# Altium footprint library DebouncingToolESD.PcbLib: 30 footprints (part 2 of 2)
Each footprint in its own frame and in the unit in brackets; x right, y up, seen from the top. Pads: shape width x height; smd on the part's side, far side on the other; paste and mask are expansions set on the pad; w line width, h text height; cw(c..) or ccw(c..) is an arc to the next point about the centre after c.
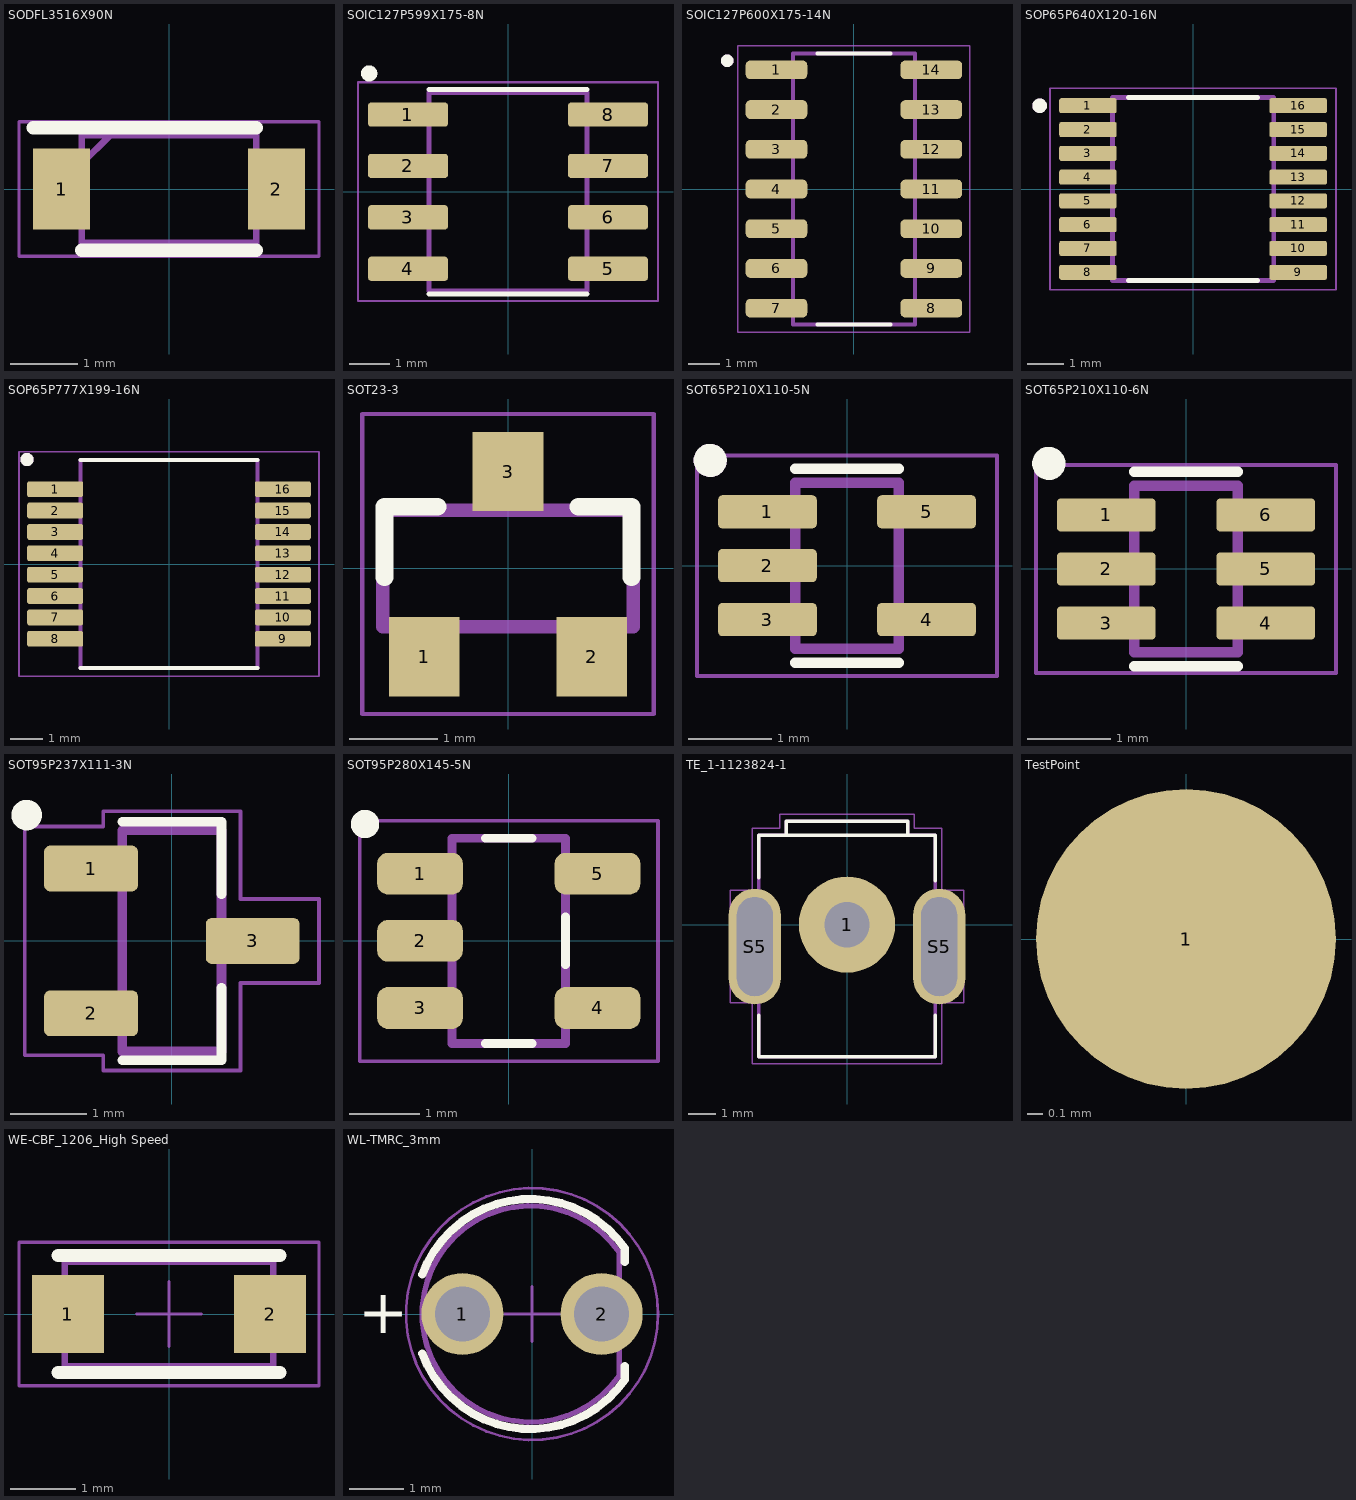
[diagram p1: the footprints below, top view; thin cyan lines are the x and y axes]

## SODFL3516X90N [mm]
pads (2):
  rect 0.85x1.2 smd: 1(-1.6,0) 2(1.6,0)
Top Overlay:
  lines w0.2: -2.02,0.914 1.3,0.914 ; -1.3,-0.914 1.3,-0.914
Mechanical 13:
  lines w0.1: -1.3,0.38 -0.88,0.8 ; -1.3,-0.8 1.3,-0.8 1.3,0.8 -1.3,0.8 -1.3,-0.8
Mechanical 15:
  lines w0.05: -2.235,-1 2.235,-1 2.235,1 -2.235,1 -2.235,-1
3D body "RB160MM-50TFTR.stp": height 0.9, standoff 0, extent -1.75,-0.8 1.75,0.8

## SOIC127P599X175-8N [mm]
pads (8):
  rrect25% 1.97x0.6 smd: 1(-2.47,1.905) 2(-2.47,0.635) 3(-2.47,-0.635) 4(-2.47,-1.905) 5(2.47,-1.905) 6(2.47,-0.635) 7(2.47,0.635) 8(2.47,1.905)
Top Overlay:
  circle w0.2: c-3.429,2.921 r0.1
  lines w0.127: -1.95,-2.525 1.95,-2.525 ; -1.95,2.525 1.95,2.525
Mechanical 13:
  lines w0.127: -1.95,-2.452 -1.95,2.452 1.95,2.452 1.95,-2.452 -1.95,-2.452
Mechanical 15:
  lines w0.05: -3.705,-2.702 -3.705,2.702 3.705,2.702 3.705,-2.702 -3.705,-2.702
3D body "TLV3502AIDR.STEP": height 1.75, standoff 0, extent -3,-2.45 3,2.45

## SOIC127P600X175-14N [mm]
pads (14):
  rrect50% 1.97x0.6 smd: 1(-2.475,3.81) 2(-2.475,2.54) 3(-2.475,1.27) 4(-2.475,0) 5(-2.475,-1.27) 6(-2.475,-2.54) 7(-2.475,-3.81) 8(2.475,-3.81) 9(2.475,-2.54) 10(2.475,-1.27) 11(2.475,0) 12(2.475,1.27) 13(2.475,2.54) 14(2.475,3.81)
Top Overlay:
  circle w0.2: c-4.05,4.1 r0.1
  lines w0.127: -1.17,-4.325 1.17,-4.325 ; -1.17,4.325 1.17,4.325
Mechanical 13:
  circle w0.2: c-4.05,4.1 r0.1
  lines w0.127: -1.95,-4.325 1.95,-4.325 1.95,4.325 -1.95,4.325 -1.95,-4.325
Mechanical 15:
  lines w0.05: -3.71,-4.575 3.71,-4.575 3.71,4.575 -3.71,4.575 -3.71,-4.575
3D body "step_temp.STEP": height 1.75, standoff 0, extent -3,-4.325 3,4.325

## SOP65P640X120-16N [mm]
pads (16):
  rrect25% 1.57x0.41 smd: 1(-2.87,2.275) 2(-2.87,1.625) 3(-2.87,0.975) 4(-2.87,0.325) 5(-2.87,-0.325) 6(-2.87,-0.975) 7(-2.87,-1.625) 8(-2.87,-2.275) 9(2.87,-2.275) 10(2.87,-1.625) 11(2.87,-0.975) 12(2.87,-0.325) 13(2.87,0.325) 14(2.87,0.975) 15(2.87,1.625) 16(2.87,2.275)
Top Overlay:
  circle w0.2: c-4.19,2.275 r0.1
  lines w0.127: -1.765,-2.5 1.765,-2.5 ; -1.765,2.5 1.765,2.5
Mechanical 13:
  circle w0.2: c-4.19,2.275 r0.1
  lines w0.127: -2.2,-2.5 2.2,-2.5 2.2,2.5 -2.2,2.5 -2.2,-2.5
Mechanical 15:
  lines w0.05: -3.905,-2.75 3.905,-2.75 3.905,2.75 -3.905,2.75 -3.905,-2.75
3D body "CD74HC123PWR.STEP": height 1.2, standoff 0, extent -3.2,-2.5 3.2,2.5

## SOP65P777X199-16N [mm]
pads (16):
  rrect25% 1.7x0.48 smd: 1(-3.46,2.275) 2(-3.46,1.625) 3(-3.46,0.975) 4(-3.46,0.325) 5(-3.46,-0.325) 6(-3.46,-0.975) 7(-3.46,-1.625) 8(-3.46,-2.275) 9(3.46,-2.275) 10(3.46,-1.625) 11(3.46,-0.975) 12(3.46,-0.325) 13(3.46,0.325) 14(3.46,0.975) 15(3.46,1.625) 16(3.46,2.275)
Top Overlay:
  circle w0.2: c-4.318,3.175 r0.1
  lines w0.127: -2.69,-3.165 2.69,-3.165 ; -2.69,3.165 2.69,3.165
Mechanical 13:
  circle w0.2: c-4.318,3.175 r0.1
  lines w0.127: -2.69,-3.165 2.69,-3.165 2.69,3.165 -2.69,3.165 -2.69,-3.165
Mechanical 15:
  lines w0.05: -4.56,-3.415 4.56,-3.415 4.56,3.415 -4.56,3.415 -4.56,-3.415
3D body "21-0056C_16.step": height 1.98, standoff 0, extent -3.95,-3.162 3.95,3.162

## SOT23-3 [mm]
pads (3):
  rect 0.8x0.9 smd: 1(-0.95,-1) 2(0.95,-1) 3(0,1.1)
Top Overlay:
  lines w0.203: -1.4,-0.1 -1.4,0.7 -0.8,0.7 ; 0.8,0.7 1.4,0.7 1.4,-0.1
Mechanical 13:
  lines w0.152: -1.422,-0.66 1.422,-0.66 1.422,0.66 -1.422,0.66 -1.422,-0.66
Mechanical 15:
  lines w0.051: -1.651,-1.651 1.651,-1.651 1.651,1.753 -1.651,1.753 -1.651,-1.651
3D body "2N7002--3DModel-STEP-56544.STEP": height 1.24, standoff -0.01, extent -1.463,-1.4 1.463,1.4

## SOT65P210X110-5N [mm]
pads (5):
  rrect25% 1.19x0.4 smd: 1(-0.96,0.65) 2(-0.96,0) 3(-0.96,-0.65) 4(0.96,-0.65) 5(0.96,0.65)
Top Overlay:
  circle w0.2: c-1.651,1.27 r0.1
  lines w0.127: -0.625,-1.17 0.625,-1.17 ; -0.625,1.17 0.625,1.17
Mechanical 13:
  circle w0.2: c-1.651,1.27 r0.1
  lines w0.127: -0.625,-1 0.625,-1 0.625,1 -0.625,1 -0.625,-1
Mechanical 15:
  lines w0.05: -1.81,-1.33 1.81,-1.33 1.81,1.33 -1.81,1.33 -1.81,-1.33
3D body "3K.STEP": height 1.1, standoff 0, extent -1.05,-1 1.05,1

## SOT65P210X110-6N [mm]
pads (6):
  rrect25% 1.19x0.4 smd: 1(-0.96,0.65) 2(-0.96,0) 3(-0.96,-0.65) 4(0.96,-0.65) 5(0.96,0) 6(0.96,0.65)
Top Overlay:
  circle w0.2: c-1.651,1.27 r0.1
  lines w0.127: -0.625,-1.17 0.625,-1.17 ; -0.625,1.17 0.625,1.17
Mechanical 13:
  lines w0.127: -0.625,-1 0.625,-1 0.625,1 -0.625,1 -0.625,-1
Mechanical 15:
  lines w0.05: -1.805,-1.25 1.805,-1.25 1.805,1.25 -1.805,1.25 -1.805,-1.25
3D body "SN74LVC2G17MDCKREP.STEP": height 1.1, standoff 0, extent -1.05,-1 1.05,1

## SOT95P237X111-3N [mm]
pads (3):
  rrect25% 1.23x0.6 smd: 1(-1.06,0.95) 2(-1.06,-0.95) 3(1.06,0)
Top Overlay:
  circle w0.2: c-1.905,1.651 r0.1
  lines w0.127: -0.65,-1.564 0.65,-1.564 0.65,-0.614 ; -0.65,1.564 0.65,1.564 0.65,0.614
Mechanical 13:
  lines w0.127: -0.65,-1.45 -0.65,1.45 0.65,1.45 0.65,-1.45 -0.65,-1.45
Mechanical 15:
  lines w0.05: -1.93,-1.5 -0.9,-1.5 -0.9,-1.7 0.9,-1.7 0.9,-0.55 1.93,-0.55 1.93,0.55 0.9,0.55 0.9,1.7 -0.9,1.7 -0.9,1.5 -1.93,1.5 -1.93,-1.5
3D body "step_temp.STEP": height 1.11, standoff 0, extent -1.2,-1.45 1.2,1.45

## SOT95P280X145-5N [mm]
pads (5):
  rrect50% 1.21x0.59 smd: 1(-1.255,0.95) 2(-1.255,0) 3(-1.255,-0.95) 4(1.255,-0.95) 5(1.255,0.95)
Top Overlay:
  circle w0.2: c-2.032,1.651 r0.1
  lines w0.127: -0.33,-1.45 0.33,-1.45 ; -0.33,1.45 0.33,1.45 ; 0.8,-0.335 0.8,0.335
Mechanical 13:
  lines w0.127: -0.8,-1.45 0.8,-1.45 0.8,1.45 -0.8,1.45 -0.8,-1.45
Mechanical 15:
  lines w0.05: -2.11,-1.7 -2.11,1.7 2.11,1.7 2.11,-1.7 -2.11,-1.7
3D body "SN74LVC1G32QDBVRQ1.STEP": height 1.45, standoff 0, extent -1.4,-1.45 1.4,1.45

## TE_1-1123824-1 [mm]
pads (3):
  round 3.5 hole 1.65: 1(0,0)
  oval 1.9x4.2 hole 1.3 slot 3.6 at 90 deg: S5(-3.35,-0.8) S5(3.35,-0.8)
Top Overlay:
  lines w0.127: -3.2,-3.3 -3.2,-4.8 3.2,-4.8 3.2,-3.3 ; -3.2,1.7 -3.2,3.25 -2.2,3.25 ; 3.2,1.6 3.2,3.25 2.2,3.25 ; -2.2,3.25 2.2,3.25 ; -2.2,3.25 -2.2,3.75 2.2,3.75 2.2,3.25
Mechanical 13:
  lines w0.127: -3.2,-4.8 -3.2,3.25 -2.2,3.25 -2.2,3.75 2.2,3.75 2.2,3.25 3.2,3.25 3.2,-4.8 -3.2,-4.8
Mechanical 15:
  lines w0.05: -4.25,-2.85 -4.25,1.25 -3.45,1.25 -3.45,3.5 -2.45,3.5 -2.45,4 2.45,4 2.45,3.5 3.45,3.5 3.45,1.25 4.25,1.25 4.25,-2.85 3.45,-2.85 3.45,-5.05 -3.45,-5.05 -3.45,-2.85 -4.25,-2.85
3D body "1-1123824-1.STEP": height 14, standoff -3.1, extent -4.4,-4.8 4.4,3.75

## TestPoint [mm]
pads (1):
  round 2 smd: 1(0,0)

## WE-CBF_1206_High Speed [mm] "SMD EMI Suppression Ferrite  Bead, body 3.2x1.6mm"
height 1.3
pads (2):
  rect 1.1x1.2 smd: 1(-1.55,0) 2(1.55,0)
Top Overlay:
  lines w0.2: -1.7,-0.9 1.7,-0.9 ; -1.7,0.9 1.7,0.9
Mechanical 11:
  lines w0.1: -1.6,-0.8 -1.6,0.8 1.6,0.8 1.6,-0.8 -1.6,-0.8
Mechanical 13:
  lines w0.1: -1.6,-0.8 1.6,-0.8 1.6,0.8 -1.6,0.8 -1.6,-0.8
Mechanical 15:
  lines w0.05: -0.5,0 0.5,0 ; 0,-0.5 0,0.5 ; -2.3,-1.1 2.3,-1.1 2.3,1.1 -2.3,1.1 -2.3,-1.1
3D body "WE-CBF_1206_CBF.stp": height 1.1, standoff 0, extent -1.6,-0.8 1.6,0.8

## WL-TMRC_3mm [mm] "THT Mono-color Round Color LED, 2-leads"
height 5.3
pads (2):
  round 1.5 hole 1: 1(-1.27,0) 2(1.27,0)
Top Overlay:
  lines w0.15: -2.003,-0.719 ccw(c-0.03,0) 1.694,-1.199 1.694,-0.95 ; -2.003,0.719 cw(c-0.03,0) 1.694,1.199 1.694,0.95
  text "+" at -3.177,-0.35 h0.8
Mechanical 11:
  lines w0.1: 1.591,-1.128 cw(c-0.03,0) 1.591,1.128 1.591,-1.128
Mechanical 13:
  lines w0.1: 1.591,-1.128 cw(c-0.03,0) 1.591,1.128 1.591,-1.128
Mechanical 15:
  circle w0.05: c0,0 r2.3
  lines w0.05: -0.5,0 0.5,0 ; 0,-0.5 0,0.5
3D body "GreenLED90Col.STEP": height 4.72, standoff -3.45, extent -1.941,-0.25 1.629,12.55